# Altium footprint library rcl.PCBLIB: 513 footprints (part 16 of 33)
Each footprint in its own frame and in the unit in brackets; x right, y up, seen from the top. Pads: shape width x height; smd on the part's side, far side on the other; paste and mask are expansions set on the pad; w line width, h text height; cw(c..) or ccw(c..) is an arc to the next point about the centre after c.
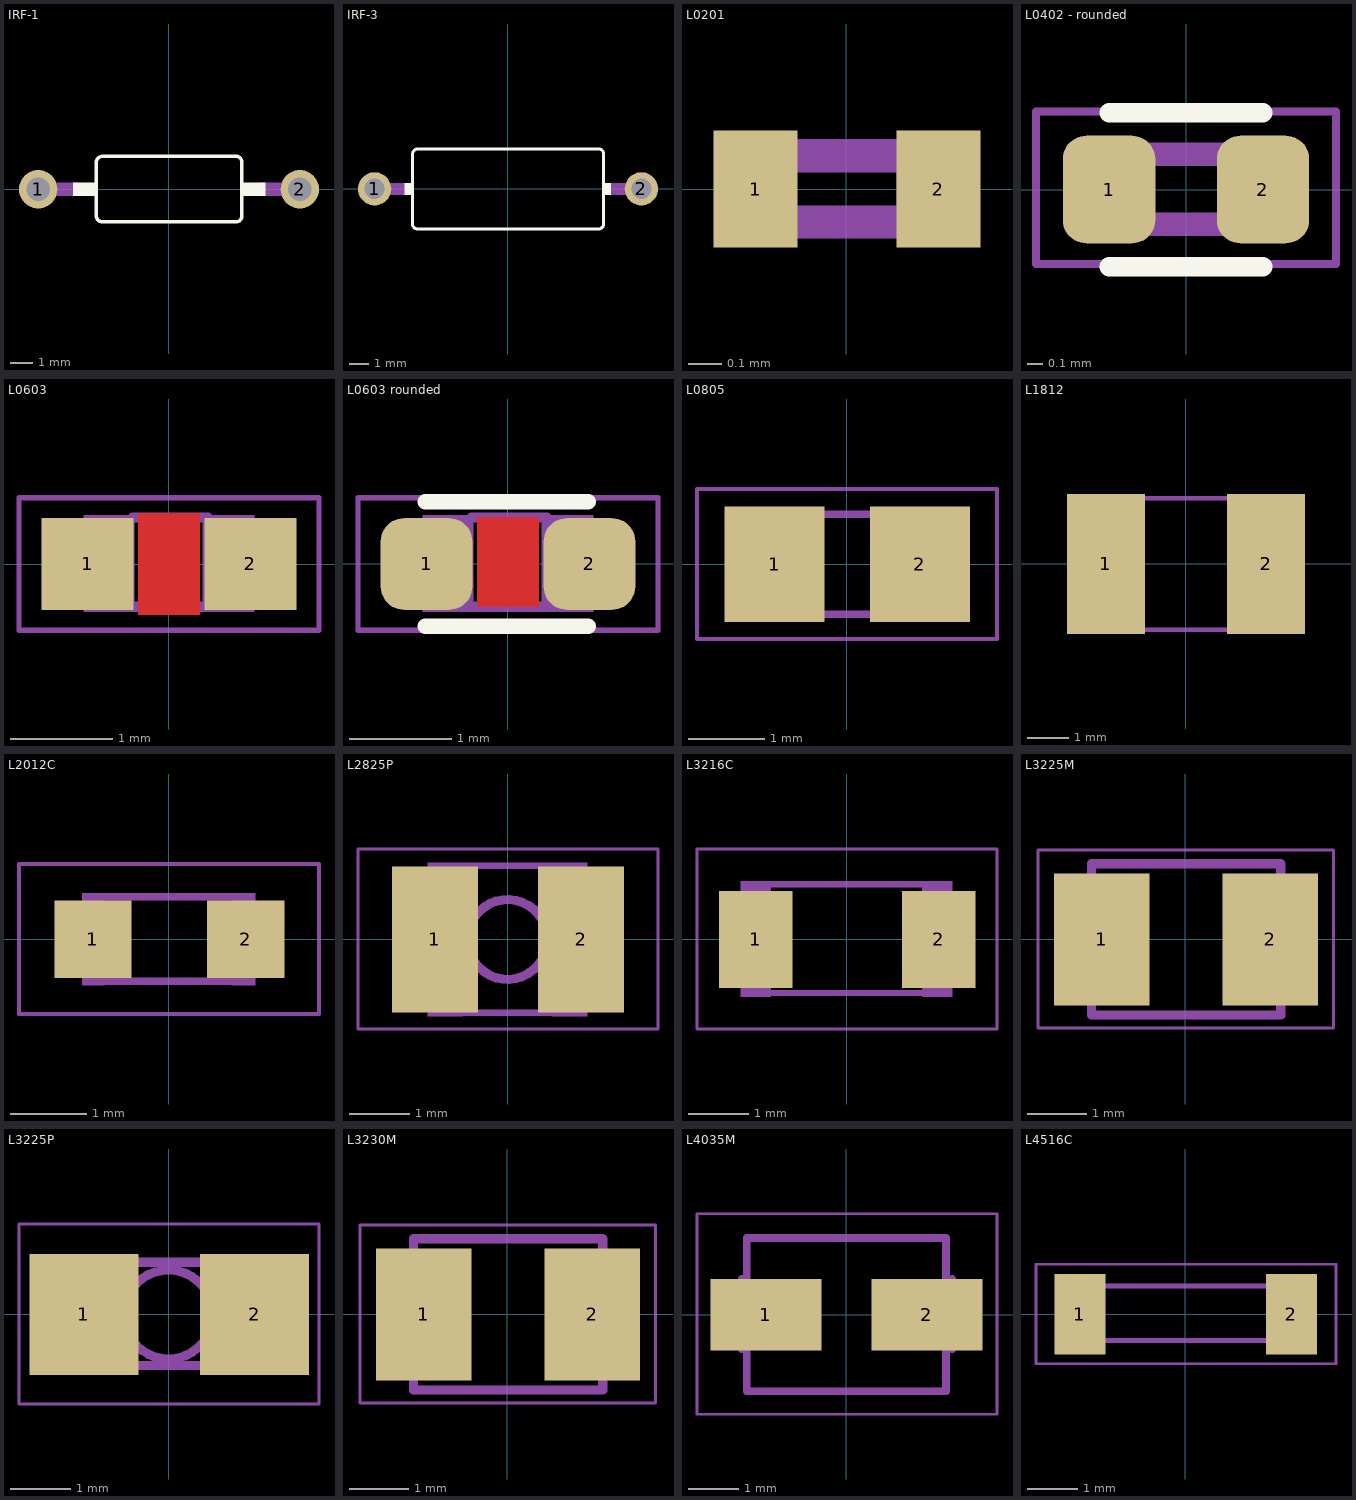
[diagram p15: the footprints below, top view; thin cyan lines are the x and y axes]

## IRF-1 [mil]
pads (2):
  round 66 hole 40: 1(-225,0) 2(225,0)
Top Overlay:
  rectangle: 125,-12 166,12
  rectangle: -165.35,-12 -125,12
  lines w6: -125,-45.83 ccw(c-114.94,-46.04) -115.16,-56.1 116,-56.1 ccw(c115.36,-46.46) 125,-45.83 125,46 ccw(c115,47) 116,57 -114.17,57 ccw(c-114.09,46.09) -125,46 -125,-45.83
Mechanical 4:
  lines w24: -225,0 -160,0 ; 160,0 225,0

## IRF-3 [mil]
pads (2):
  round 66 hole 40: 1(-263.98,0) 2(265,0)
Top Overlay:
  rectangle: -204.72,-12 -188.98,12
  rectangle: 190,-12 205,12
  lines w6: -188.98,-69.45 ccw(c-178.92,-69.67) -179.13,-79.72 181,-79.72 ccw(c180.36,-70.09) 190,-69.45 190,69 ccw(c180.5,69.5) 181,79 -178.15,79 ccw(c-178.56,68.59) -188.98,69 -188.98,-69.45
Mechanical 4:
  lines w24: -263.98,0 -205.71,0 ; 205,0 265,0

## L0201 [mil]
pads (2):
  rect 10x14 smd: 1(-10.83,0) 2(11,0)
Mechanical 4:
  rectangle: -5.91,-5.91 6,-1.97
  rectangle: -5.91,2 6,6
  rectangle: 6,-5.91 12,6
  rectangle: -11.81,-5.91 -5.91,6

## L0402 - rounded [mm]
pads (2):
  rrect50% 0.6x0.7 smd: 1(-0.5,0) 2(0.5,0)
Top Overlay:
  lines w0.127: -0.5,-0.5 0.5,-0.5 ; -0.5,0.5 0.5,0.5
Mechanical 4:
  rectangle: -0.554,-0.305 -0.254,0.305
  rectangle: 0.279,-0.305 0.559,0.305
  lines w0.051: -0.975,-0.483 0.975,-0.483 0.975,0.508 -0.975,0.508 -0.975,-0.483
  lines w0.152: -0.245,-0.224 0.254,-0.224 ; -0.245,0.229 0.254,0.229
3D body "User Library-0402C.step": height 0.36, standoff 0, extent -0.5,-0.265 0.5,0.265

## L0603 [mm]
pads (2):
  rect 0.9x0.9 smd: 1(-0.8,0) 2(0.8,0)
Top Layer:
  pour cut-out: -0.3,0.5 0.3,0.5 0.3,-0.5 -0.3,-0.5
Mechanical 4:
  rectangle: -0.838,-0.47 -0.338,0.483
  rectangle: 0.33,-0.47 0.838,0.483
  lines w0.051: -1.473,-0.65 1.473,-0.65 1.473,0.65 -1.473,0.65 -1.473,-0.65
  lines w0.102: -0.356,-0.419 0.381,-0.419 ; -0.356,0.457 0.381,0.457
3D body "User Library-FB_1608-1.STEP": height 0.8, standoff 0, extent -0.8,-0.4 0.8,0.4

## L0603 rounded [mm]
pads (2):
  rrect50% 0.9x0.9 smd: 1(-0.8,0) 2(0.8,0)
Top Layer:
  pour cut-out: -0.3,0.457 -0.3,-0.419 0.3,-0.419 0.3,0.457
Top Overlay:
  lines w0.152: -0.813,-0.61 0.787,-0.61 ; -0.813,0.61 0.787,0.61
Mechanical 4:
  rectangle: -0.838,-0.47 -0.338,0.483
  rectangle: 0.33,-0.47 0.838,0.483
  lines w0.051: -1.473,-0.65 1.473,-0.65 1.473,0.65 -1.473,0.65 -1.473,-0.65
  lines w0.102: -0.356,-0.419 0.381,-0.419 ; -0.356,0.457 0.381,0.457
3D body "User Library-FB_1608-1.STEP": height 0.8, standoff 0, extent -0.8,-0.4 0.8,0.4

## L0805 [mil]
pads (2):
  rect 52x60 smd: 1(-37.4,0) 2(38,0)
Mechanical 4:
  rectangle: 14,-28.5 44,29
  rectangle: -43,-28.5 -13.47,29
  lines w2: -77.68,-38.7 -77.68,39 78,39 78,-38.7 -77.68,-38.7
  lines w4: -15,26 15,26 ; -14.02,-25.98 15,-25.98
3D body "User Library-ind_0805.step": height 37.4, standoff 0, extent -39.37,-23.62 39.37,23.63

## L1812 [mil]
pads (2):
  rect 75x134 smd: 1(-76.77,0) 2(77,0)
Mechanical 4:
  rectangle: -94,-65 -56.6,65
  rectangle: 57,-65 95,65
  lines w4: -58,63 58,63 ; -57,-63 58,-63

## L2012C [mil]
pads (2):
  rect 40x40 smd: 1(-39.37,0) 2(40,0)
Mechanical 4:
  rectangle: 33,-24 45,24
  rectangle: -45,-24 -33.19,24
  lines w2: -77.68,-38.7 -77.68,39 78,39 78,-38.7 -77.68,-38.7
  lines w4: -34.02,-21.77 35,-21.77 ; -34.02,22 35,22

## L2825P [mil]
pads (2):
  rect 56x95 smd: 1(-47.24,0) 2(48,0)
Mechanical 4:
  circle w6: c0,0 r26
  rectangle: 29,-50 52,50
  rectangle: -52,-50 -29,50
  lines w2: -97.36,-58.39 98,-58.39 98,59 -97.36,59 -97.36,-58.39
  lines w4: -52.76,-37.99 -52.76,38 ; -30,-47.76 30,-47.76 ; -30,48 30,48 ; 53,-37.99 53,38

## L3216C [mil]
pads (2):
  rect 48x63 smd: 1(-59.06,0) 2(60,0)
Mechanical 4:
  rectangle: -69,-37.5 -49.31,38
  rectangle: 49,-37.5 69,38
  lines w2: -97.36,-58.39 98,-58.39 98,59 -97.36,59 -97.36,-58.39
  lines w4: -50,-34.76 50,-34.76 ; -50,36 50,36

## L3225M [mil]
pads (2):
  rect 63x87 smd: 1(-55.12,0) 2(56,0)
Mechanical 4:
  lines w2: -97.36,-58.39 -97.36,59 98,59 98,-58.39 -97.36,-58.39
  lines w6: -65,-37.01 -65,38 ; 65,-37.01 65,38 ; -62.01,-50 -62.01,50 63,50 63,-50 -62.01,-50

## L3225P [mil]
pads (2):
  rect 71x79 smd: 1(-55.12,0) 2(56,0)
Mechanical 4:
  circle w6: c0,0 r29
  lines w2: -97.36,-58.39 -97.36,59 98,59 98,-58.39 -97.36,-58.39
  lines w6: -65.98,-33.27 66,-33.27 ; -65.98,-32.99 -65.98,33 ; -65.98,34 66,34 ; -45.98,-32.99 -45.98,33 ; 46,-32.99 46,33 ; 66,-32.99 66,33

## L3230M [mil]
pads (2):
  rect 63x87 smd: 1(-55.12,0) 2(56,0)
Mechanical 4:
  lines w2: -97.36,-58.39 98,-58.39 98,59 -97.36,59 -97.36,-58.39
  lines w6: -65,-37.01 -65,38 ; 65,-37.01 65,38 ; -62.01,-50 63,-50 63,50 -62.01,50 -62.01,-50

## L4035M [mil]
pads (2):
  rect 87x56 smd: 1(-62.99,0) 2(63,0)
Mechanical 4:
  lines w2: -117.05,-78.07 -117.05,79 118,79 118,-78.07 -117.05,-78.07
  lines w6: -82.01,-27.01 -82.01,28 ; 83,-27.01 83,28 ; -77.99,-60 78,-60 78,60 -77.99,60 -77.99,-60

## L4516C [mil]
pads (2):
  rect 40x63 smd: 1(-82.68,0) 2(83,0)
Mechanical 4:
  rectangle: -94.5,-23.5 -63,24
  rectangle: 63,-23.74 95,24
  lines w2: -117.05,-38.7 118,-38.7 118,39 -117.05,39 -117.05,-38.7
  lines w4: -64.02,-20.75 65,-20.75 ; -64.02,22 65,22